# Altium footprint library Molex FFC - FPC Connectors (Through-Hole).PcbLib: 219 footprints (part 4 of 14)
Each footprint in its own frame and in the unit in brackets; x right, y up, seen from the top. Pads: shape width x height; smd on the part's side, far side on the other; paste and mask are expansions set on the pad; w line width, h text height; cw(c..) or ccw(c..) is an arc to the next point about the centre after c.
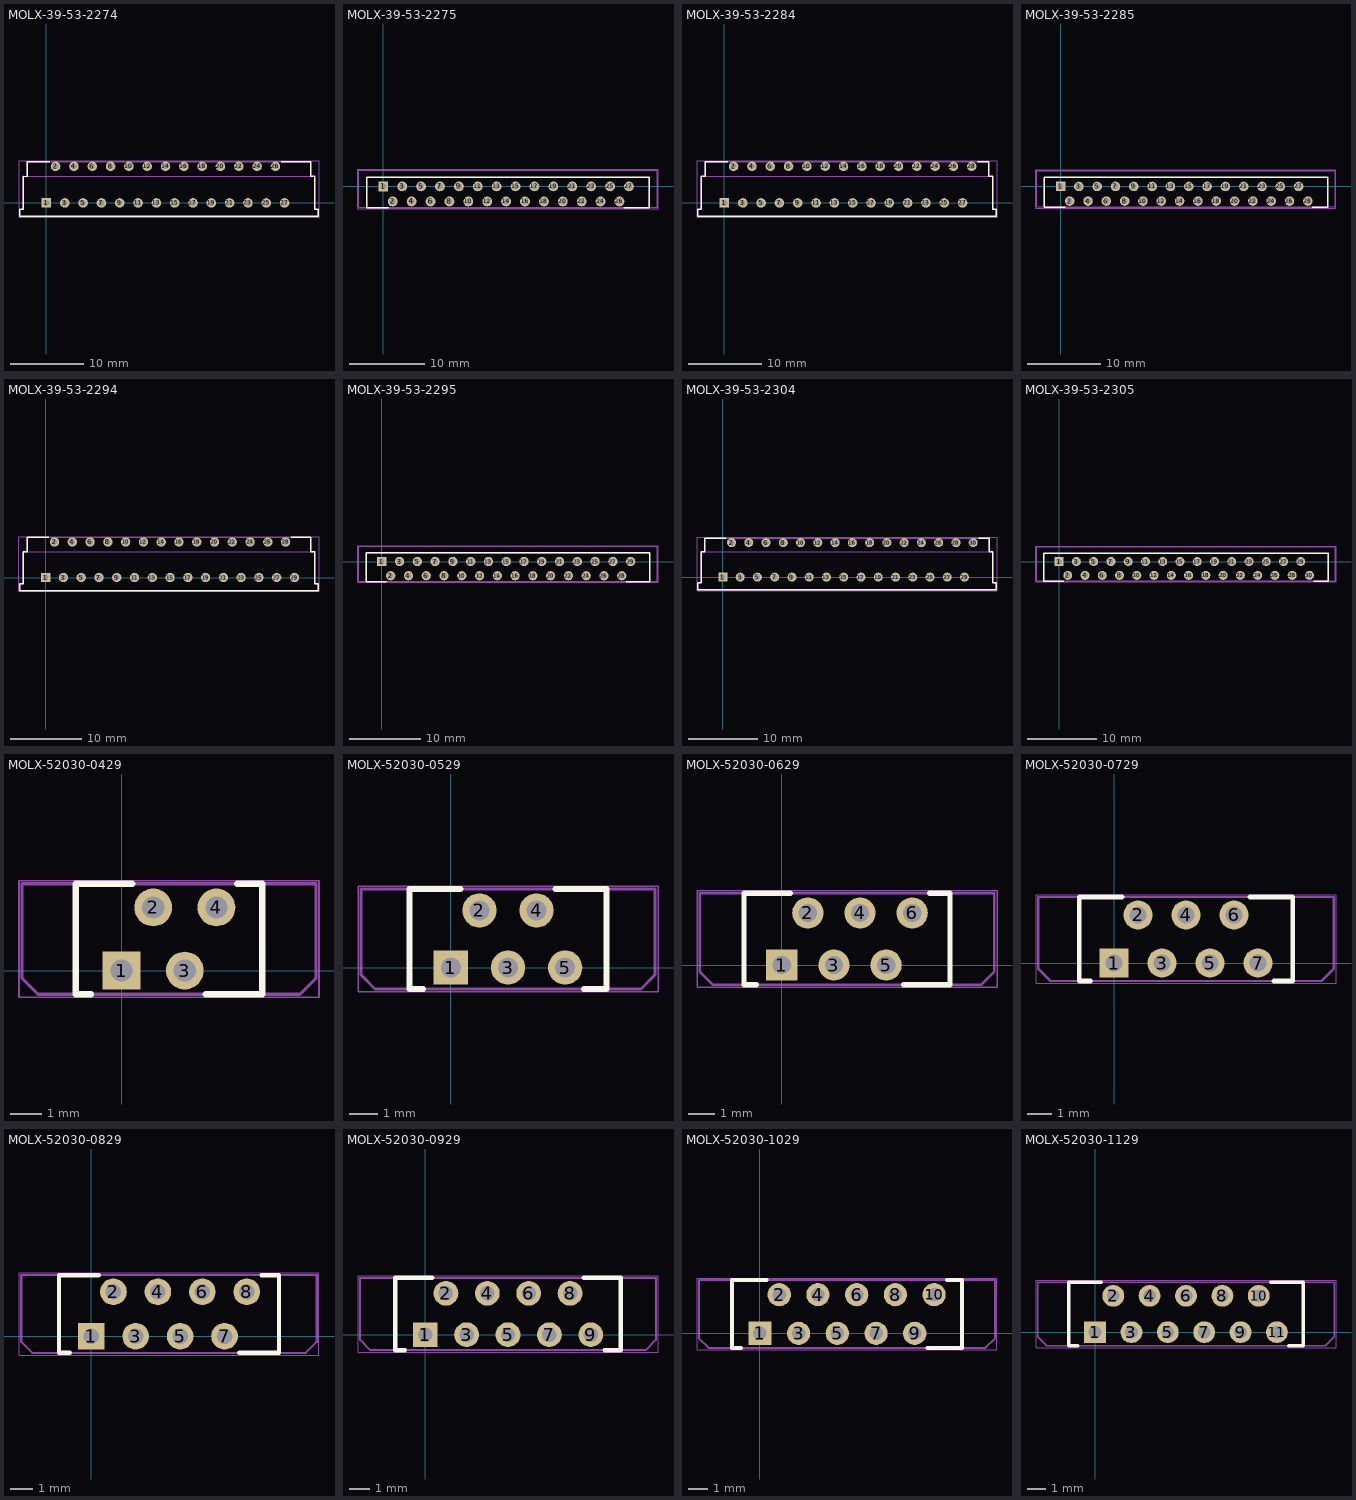
[diagram p3: the footprints below, top view; thin cyan lines are the x and y axes]

## MOLX-39-53-2274 [mm] "FPC Connector, 27-Leads, Right Angle, Pitch 1.25 mm, Mated Height 5.0 mm, Through Hole"
height 5.412
pads (27):
  rect 1.3x1.3 hole 0.8: 1(0,0)
  round 1.3 hole 0.8: 2(1.25,5) 3(2.5,0) 4(3.75,5) 5(5,0) 6(6.25,5) 7(7.5,0) 8(8.75,5) 9(10,0) 10(11.25,5) 11(12.5,0) 12(13.75,5) 13(15,0) 14(16.25,5) 15(17.5,0) 16(18.75,5) 17(20,0) 18(21.25,5) 19(22.5,0) 20(23.75,5) 21(25,0) 22(26.25,5) 23(27.5,0) 24(28.75,5) 25(30,0) 26(31.25,5) 27(32.5,0)
Top Overlay:
  lines w0.2: -2.62,3.6 -3.15,3.65 -3.15,-0.85 -3.65,-0.85 -3.65,-1.85 37.1,-1.85 37.1,-0.85 36.6,-0.85 36.6,3.65 36.07,3.65 36.07,5.65 32.075,5.65 ; -2.62,3.65 -2.62,5.65 0.425,5.65
Mechanical 13:
  lines w0.1: -2.62,3.65 -2.62,5.65 36.07,5.65 36.07,3.65 ; -2.62,3.65 -3.15,3.65 -3.15,-0.85 -3.65,-0.85 -3.65,-1.85 37.1,-1.85 37.1,-0.85 36.6,-0.85 36.6,3.65 36.07,3.65 ; -2.62,3.65 36.07,3.65
Mechanical 15:
  lines w0.05: -3.75,-1.95 -3.75,5.75 37.2,5.75 37.2,-1.95 -3.75,-1.95
3D body "039532284.stp": height 5.41, standoff -3.49, extent -3.649,-1.849 37.101,5.651

## MOLX-39-53-2275 [mm] "FPC Connector, 27-Leads, Vertical, Pitch 1.25 mm, Mated Height 7.5 mm, Through Hole"
height 7.512
pads (27):
  rect 1.3x1.3 hole 0.8: 1(0,0)
  round 1.3 hole 0.8: 2(1.25,-2) 3(2.5,0) 4(3.75,-2) 5(5,0) 6(6.25,-2) 7(7.5,0) 8(8.75,-2) 9(10,0) 10(11.25,-2) 11(12.5,0) 12(13.75,-2) 13(15,0) 14(16.25,-2) 15(17.5,0) 16(18.75,-2) 17(20,0) 18(21.25,-2) 19(22.5,0) 20(23.75,-2) 21(25,0) 22(26.25,-2) 23(27.5,0) 24(28.75,-2) 25(30,0) 26(31.25,-2) 27(32.5,0)
Top Overlay:
  lines w0.2: 0.633,-2.85 -2.22,-2.85 -2.22,1.22 35.22,1.22 35.22,-2.85 31.867,-2.85
Mechanical 13:
  lines w0.1: -3.25,-2.75 -3.25,2.15 36.25,2.15 36.25,-2.75 -3.25,-2.75 ; -2.22,-2.85 35.22,-2.85 35.22,1.22 -2.22,1.22 -2.22,-2.85
Mechanical 15:
  lines w0.05: -3.35,-2.95 36.35,-2.95 36.35,2.25 -3.35,2.25 -3.35,-2.95
3D body "039532275.stp": height 7.51, standoff -3.49, extent -3.25,-2.85 36.25,2.15

## MOLX-39-53-2284 [mm] "FPC Connector, 28-Leads, Right Angle, Pitch 1.25 mm, Mated Height 5.0 mm, Through Hole"
height 5.412
pads (28):
  rect 1.3x1.3 hole 0.8: 1(0,0)
  round 1.3 hole 0.8: 2(1.25,5) 3(2.5,0) 4(3.75,5) 5(5,0) 6(6.25,5) 7(7.5,0) 8(8.75,5) 9(10,0) 10(11.25,5) 11(12.5,0) 12(13.75,5) 13(15,0) 14(16.25,5) 15(17.5,0) 16(18.75,5) 17(20,0) 18(21.25,5) 19(22.5,0) 20(23.75,5) 21(25,0) 22(26.25,5) 23(27.5,0) 24(28.75,5) 25(30,0) 26(31.25,5) 27(32.5,0) 28(33.75,5)
Top Overlay:
  lines w0.2: 0.425,5.65 -2.62,5.65 -2.62,3.65 -3.15,3.65 -3.15,-0.85 -3.65,-0.85 -3.65,-1.85 37.1,-1.85 37.1,-0.85 36.6,-0.85 36.6,3.65 36.07,3.65 36.07,5.65 34.575,5.65 ; 37.075,-1.85 37.075,-1.85
Mechanical 13:
  lines w0.1: -2.62,3.65 36.07,3.65 ; -2.62,3.65 -2.62,5.65 36.07,5.65 36.07,3.65 ; -2.62,3.65 -3.15,3.65 -3.15,-0.85 -3.65,-0.85 -3.65,-1.85 37.1,-1.85 37.1,-0.85 36.6,-0.85 36.6,3.65 36.07,3.65
Mechanical 15:
  lines w0.05: -3.75,-1.95 37.2,-1.95 37.2,5.75 -3.75,5.75 -3.75,-1.95
3D body "039532284.stp": height 5.41, standoff -3.49, extent -3.65,-1.85 37.1,5.65

## MOLX-39-53-2285 [mm] "FPC Connector, 28-Leads, Vertical, Pitch 1.25 mm, Mated Height 7.5 mm, Through Hole"
height 7.512
pads (28):
  rect 1.3x1.3 hole 0.8: 1(0,0)
  round 1.3 hole 0.8: 2(1.25,-2) 3(2.5,0) 4(3.75,-2) 5(5,0) 6(6.25,-2) 7(7.5,0) 8(8.75,-2) 9(10,0) 10(11.25,-2) 11(12.5,0) 12(13.75,-2) 13(15,0) 14(16.25,-2) 15(17.5,0) 16(18.75,-2) 17(20,0) 18(21.25,-2) 19(22.5,0) 20(23.75,-2) 21(25,0) 22(26.25,-2) 23(27.5,0) 24(28.75,-2) 25(30,0) 26(31.25,-2) 27(32.5,0) 28(33.75,-2)
Top Overlay:
  lines w0.2: 0.633,-2.85 -2.22,-2.85 -2.22,1.22 36.47,1.22 36.47,-2.85 34.367,-2.85
Mechanical 13:
  lines w0.1: -3.25,-2.75 -3.25,2.15 37.5,2.15 37.5,-2.75 -3.25,-2.75 ; -2.22,-2.85 36.47,-2.85 36.47,1.22 -2.22,1.22 -2.22,-2.85
Mechanical 15:
  lines w0.05: -3.35,-2.95 37.6,-2.95 37.6,2.25 -3.35,2.25 -3.35,-2.95
3D body "039532285.stp": height 7.51, standoff -3.49, extent -3.25,-2.85 37.5,2.15

## MOLX-39-53-2294 [mm] "FPC Connector, 29-Leads, Right Angle, Pitch 1.25 mm, Mated Height 5.0 mm, Through Hole"
height 5.412
pads (29):
  rect 1.3x1.3 hole 0.8: 1(0,0)
  round 1.3 hole 0.8: 2(1.25,5) 3(2.5,0) 4(3.75,5) 5(5,0) 6(6.25,5) 7(7.5,0) 8(8.75,5) 9(10,0) 10(11.25,5) 11(12.5,0) 12(13.75,5) 13(15,0) 14(16.25,5) 15(17.5,0) 16(18.75,5) 17(20,0) 18(21.25,5) 19(22.5,0) 20(23.75,5) 21(25,0) 22(26.25,5) 23(27.5,0) 24(28.75,5) 25(30,0) 26(31.25,5) 27(32.5,0) 28(33.75,5) 29(35,0)
Top Overlay:
  lines w0.2: 0.425,5.65 -2.62,5.65 -2.62,3.65 -3.15,3.65 -3.15,-0.85 -3.65,-0.85 -3.65,-1.85 38.35,-1.85 38.35,-0.85 37.85,-0.85 37.85,3.65 37.32,3.65 37.32,5.65 34.575,5.65 ; 38.325,-1.85 38.325,-1.85
Mechanical 13:
  lines w0.1: -2.62,3.65 -2.62,5.65 37.32,5.65 37.32,3.65 ; -2.62,3.65 -3.15,3.65 -3.15,-0.85 -3.65,-0.85 -3.65,-1.85 38.35,-1.85 38.35,-0.85 37.85,-0.85 37.85,3.65 37.32,3.65 ; -2.62,3.65 37.32,3.65
Mechanical 15:
  lines w0.05: -3.75,-1.95 -3.75,5.75 38.45,5.75 38.45,-1.95 -3.75,-1.95
3D body "039532294.stp": height 5.41, standoff -3.49, extent -3.65,-1.85 38.35,5.651

## MOLX-39-53-2295 [mm] "FPC Connector, 29-Leads, Vertical, Pitch 1.25 mm, Mated Height 7.5 mm, Through Hole"
height 7.512
pads (29):
  rect 1.3x1.3 hole 0.8: 1(0,0)
  round 1.3 hole 0.8: 2(1.25,-2) 3(2.5,0) 4(3.75,-2) 5(5,0) 6(6.25,-2) 7(7.5,0) 8(8.75,-2) 9(10,0) 10(11.25,-2) 11(12.5,0) 12(13.75,-2) 13(15,0) 14(16.25,-2) 15(17.5,0) 16(18.75,-2) 17(20,0) 18(21.25,-2) 19(22.5,0) 20(23.75,-2) 21(25,0) 22(26.25,-2) 23(27.5,0) 24(28.75,-2) 25(30,0) 26(31.25,-2) 27(32.5,0) 28(33.75,-2) 29(35,0)
Top Overlay:
  lines w0.2: 0.633,-2.85 -2.22,-2.85 -2.22,1.22 37.72,1.22 37.72,-2.85 34.367,-2.85
Mechanical 13:
  lines w0.1: -3.25,-2.75 -3.25,2.15 38.75,2.15 38.75,-2.75 -3.25,-2.75 ; -2.22,-2.85 37.72,-2.85 37.72,1.22 -2.22,1.22 -2.22,-2.85
Mechanical 15:
  lines w0.05: -3.35,-2.95 38.85,-2.95 38.85,2.25 -3.35,2.25 -3.35,-2.95
3D body "039532295.stp": height 7.51, standoff -3.49, extent -3.25,-2.85 38.75,2.15

## MOLX-39-53-2304 [mm] "FPC Connector, 30-Leads, Right Angle, Pitch 1.25 mm, Mated Height 5.0 mm, Through Hole"
height 5.412
pads (30):
  rect 1.3x1.3 hole 0.8: 1(0,0)
  round 1.3 hole 0.8: 2(1.25,5) 3(2.5,0) 4(3.75,5) 5(5,0) 6(6.25,5) 7(7.5,0) 8(8.75,5) 9(10,0) 10(11.25,5) 11(12.5,0) 12(13.75,5) 13(15,0) 14(16.25,5) 15(17.5,0) 16(18.75,5) 17(20,0) 18(21.25,5) 19(22.5,0) 20(23.75,5) 21(25,0) 22(26.25,5) 23(27.5,0) 24(28.75,5) 25(30,0) 26(31.25,5) 27(32.5,0) 28(33.75,5) 29(35,0) 30(36.25,5)
Top Overlay:
  lines w0.2: 0.425,5.65 -2.62,5.65 -2.62,3.649 -3.15,3.649 -3.15,-0.85 -3.65,-0.85 -3.65,-1.85 39.6,-1.85 39.6,-0.85 39.1,-0.85 39.1,3.65 38.57,3.65 38.57,5.65 37.075,5.65 ; 39.575,-1.85 39.575,-1.85
Mechanical 13:
  lines w0.1: -2.62,3.649 -3.15,3.649 -3.15,-0.85 -3.65,-0.85 -3.65,-1.85 39.6,-1.85 39.6,-0.85 39.1,-0.85 39.1,3.65 38.57,3.65 38.57,5.65 -2.62,5.65 -2.62,3.649 38.569,3.649
Mechanical 15:
  lines w0.05: -3.75,-1.95 -3.75,5.75 39.7,5.75 39.7,-1.95 -3.75,-1.95
3D body "039532304.stp": height 5.41, standoff -3.49, extent -3.65,-1.85 39.6,5.65

## MOLX-39-53-2305 [mm] "FPC Connector, 30-Leads, Vertical, Pitch 1.25 mm, Mated Height 7.5 mm, Through Hole"
height 7.512
pads (30):
  rect 1.3x1.3 hole 0.8: 1(0,0)
  round 1.3 hole 0.8: 2(1.25,-2) 3(2.5,0) 4(3.75,-2) 5(5,0) 6(6.25,-2) 7(7.5,0) 8(8.75,-2) 9(10,0) 10(11.25,-2) 11(12.5,0) 12(13.75,-2) 13(15,0) 14(16.25,-2) 15(17.5,0) 16(18.75,-2) 17(20,0) 18(21.25,-2) 19(22.5,0) 20(23.75,-2) 21(25,0) 22(26.25,-2) 23(27.5,0) 24(28.75,-2) 25(30,0) 26(31.25,-2) 27(32.5,0) 28(33.75,-2) 29(35,0) 30(36.25,-2)
Top Overlay:
  lines w0.2: 0.633,-2.85 -2.22,-2.85 -2.22,1.22 38.97,1.22 38.97,-2.85 36.867,-2.85
Mechanical 13:
  lines w0.1: -3.25,-2.75 40,-2.75 40,2.15 -3.25,2.15 -3.25,-2.75 ; -2.22,-2.85 -2.22,1.22 38.97,1.22 38.97,-2.85 -2.22,-2.85
Mechanical 15:
  lines w0.05: -3.35,-2.95 -3.35,2.25 40.1,2.25 40.1,-2.95 -3.35,-2.95
3D body "039532305.stp": height 7.51, standoff -3.49, extent -3.25,-2.85 40,2.15

## MOLX-52030-0429 [mm] "FPC Connector, 4-Leads, Vertical, Pitch 1.0 mm, Mated Height 5.2 mm, Through Hole"
height 6.712
pads (4):
  rect 1.2x1.2 hole 0.7: 1(0,0)
  round 1.2 hole 0.7: 2(1,2) 3(2,0) 4(3,2)
Top Overlay:
  lines w0.2: -0.971,-0.75 -1.45,-0.75 -1.45,2.75 0.339,2.75 ; 2.661,-0.75 4.45,-0.75 4.45,2.75 3.662,2.75
Mechanical 13:
  lines w0.1: -1.45,-0.75 -1.45,2.75 ; 4.45,-0.75 4.45,2.75 ; 6.15,-0.25 6.15,2.75 -3.15,2.75 -3.15,-0.25 -2.65,-0.75 5.65,-0.75 6.15,-0.25
Mechanical 15:
  lines w0.05: -3.25,-0.85 6.25,-0.85 6.25,2.85 -3.25,2.85 -3.25,-0.85
3D body "520300429.stp": height 6.71, standoff -3.19, extent -3.15,-0.75 6.15,2.75

## MOLX-52030-0529 [mm] "FPC Connector, 5-Leads, Vertical, Pitch 1.0 mm, Mated Height 5.2 mm, Through Hole"
height 6.712
pads (5):
  rect 1.2x1.2 hole 0.7: 1(0,0)
  round 1.2 hole 0.7: 2(1,2) 3(2,0) 4(3,2) 5(4,0)
Top Overlay:
  lines w0.2: -0.971,-0.75 -1.45,-0.75 -1.45,2.75 0.339,2.75 ; 3.661,2.75 5.45,2.75 5.45,-0.75 4.661,-0.75
Mechanical 13:
  lines w0.1: -1.45,-0.75 -1.45,2.75 ; 5.45,-0.75 5.45,2.75 ; -3.15,-0.25 -2.65,-0.75 6.65,-0.75 7.15,-0.25 7.15,2.75 -3.15,2.75 -3.15,-0.25
Mechanical 15:
  lines w0.05: -3.25,-0.85 7.25,-0.85 7.25,2.85 -3.25,2.85 -3.25,-0.85
3D body "520300529.stp": height 6.71, standoff -3.19, extent -3.15,-0.75 7.15,2.75

## MOLX-52030-0629 [mm] "FPC Connector, 6-Leads, Vertical, Pitch 1.0 mm, Mated Height 5.2 mm, Through Hole"
height 6.712
pads (6):
  rect 1.2x1.2 hole 0.7: 1(0,0)
  round 1.2 hole 0.7: 2(1,2) 3(2,0) 4(3,2) 5(4,0) 6(5,2)
Top Overlay:
  lines w0.2: -0.971,-0.75 -1.45,-0.75 -1.45,2.75 0.339,2.75 ; 4.661,-0.75 6.45,-0.75 6.45,2.75 5.662,2.75
Mechanical 13:
  lines w0.1: -1.45,-0.75 -1.45,2.75 ; 6.45,-0.75 6.45,2.75 ; -3.15,-0.25 -3.15,2.75 8.15,2.75 8.15,-0.25 7.65,-0.75 -2.65,-0.75 -3.15,-0.25
Mechanical 15:
  lines w0.05: -3.25,-0.85 -3.25,2.85 8.25,2.85 8.25,-0.85 -3.25,-0.85
3D body "520300629.stp": height 6.71, standoff -3.19, extent -3.15,-0.75 8.15,2.75

## MOLX-52030-0729 [mm] "FPC Connector, 7-Leads, Vertical, Pitch 1.0 mm, Mated Height 5.2 mm, Through Hole"
height 6.712
pads (7):
  rect 1.2x1.2 hole 0.7: 1(0,0)
  round 1.2 hole 0.7: 2(1,2) 3(2,0) 4(3,2) 5(4,0) 6(5,2) 7(6,0)
Top Overlay:
  lines w0.2: -0.971,-0.75 -1.45,-0.75 -1.45,2.75 0.339,2.75 ; 5.661,2.75 7.45,2.75 7.45,-0.75 6.661,-0.75
Mechanical 13:
  lines w0.1: -1.45,-0.75 -1.45,2.75 ; 7.45,-0.75 7.45,2.75 ; -3.15,-0.25 -3.15,2.75 9.15,2.75 9.15,-0.25 8.65,-0.75 -2.65,-0.75 -3.15,-0.25
Mechanical 15:
  lines w0.05: -3.25,-0.85 -3.25,2.85 9.25,2.85 9.25,-0.85 -3.25,-0.85
3D body "520300729.stp": height 6.71, standoff -3.19, extent -3.15,-0.75 9.15,2.75

## MOLX-52030-0829 [mm] "FPC Connector, 8-Leads, Vertical, Pitch 1.0 mm, Mated Height 5.2 mm, Through Hole"
height 6.712
pads (8):
  rect 1.2x1.2 hole 0.7: 1(0,0)
  round 1.2 hole 0.7: 2(1,2) 3(2,0) 4(3,2) 5(4,0) 6(5,2) 7(6,0) 8(7,2)
Top Overlay:
  lines w0.2: -0.971,-0.75 -1.45,-0.75 -1.45,2.75 0.339,2.75 ; 6.661,-0.75 8.45,-0.75 8.45,2.75 7.662,2.75
Mechanical 13:
  lines w0.1: -1.45,-0.75 -1.45,2.75 ; 8.45,-0.75 8.45,2.75 ; -3.15,-0.25 -2.65,-0.75 9.65,-0.75 10.15,-0.25 10.15,2.75 -3.15,2.75 -3.15,-0.25
Mechanical 15:
  lines w0.05: -3.25,-0.85 10.25,-0.85 10.25,2.85 -3.25,2.85 -3.25,-0.85
3D body "520300829.stp": height 6.71, standoff -3.19, extent -3.15,-0.75 10.15,2.75

## MOLX-52030-0929 [mm] "FPC Connector, 9-Leads, Vertical, Pitch 1.0 mm, Mated Height 5.2 mm, Through Hole"
height 6.712
pads (9):
  rect 1.2x1.2 hole 0.7: 1(0,0)
  round 1.2 hole 0.7: 2(1,2) 3(2,0) 4(3,2) 5(4,0) 6(5,2) 7(6,0) 8(7,2) 9(8,0)
Top Overlay:
  lines w0.2: -0.971,-0.75 -1.45,-0.75 -1.45,2.75 0.339,2.75 ; 7.661,2.75 9.45,2.75 9.45,-0.75 8.661,-0.75
Mechanical 13:
  lines w0.1: -1.45,-0.75 -1.45,2.75 ; 9.45,-0.75 9.45,2.75 ; 11.15,-0.25 11.15,2.75 ; 11.15,-0.25 10.65,-0.75 -2.65,-0.75 -3.15,-0.25 -3.15,2.75 11.15,2.75
Mechanical 15:
  lines w0.05: -3.25,-0.85 11.25,-0.85 11.25,2.85 -3.25,2.85 -3.25,-0.85
3D body "520300929.stp": height 6.71, standoff -3.19, extent -3.15,-0.75 11.15,2.75

## MOLX-52030-1029 [mm] "FPC Connector, 10-Leads, Vertical, Pitch 1.0 mm, Mated Height 5.2 mm, Through Hole"
height 6.712
pads (10):
  rect 1.2x1.2 hole 0.7: 1(0,0)
  round 1.2 hole 0.7: 2(1,2) 3(2,0) 4(3,2) 5(4,0) 6(5,2) 7(6,0) 8(7,2) 9(8,0) 10(9,2)
Top Overlay:
  lines w0.2: -0.971,-0.75 -1.45,-0.75 -1.45,2.75 0.339,2.75 ; 8.661,-0.75 10.45,-0.75 10.45,2.75 9.662,2.75
Mechanical 13:
  lines w0.1: -1.45,-0.75 -1.45,2.75 ; 10.45,-0.75 10.45,2.75 ; -3.15,-0.25 -3.15,2.75 12.15,2.75 12.15,-0.25 11.65,-0.75 -2.65,-0.75 -3.15,-0.25
Mechanical 15:
  lines w0.05: -3.25,-0.85 -3.25,2.85 12.25,2.85 12.25,-0.85 -3.25,-0.85
3D body "520301029.stp": height 6.71, standoff -3.19, extent -3.15,-0.75 12.15,2.75

## MOLX-52030-1129 [mm] "FPC Connector, 11-Leads, Vertical, Pitch 1.0 mm, Mated Height 5.2 mm, Through Hole"
height 6.712
pads (11):
  rect 1.2x1.2 hole 0.7: 1(0,0)
  round 1.2 hole 0.7: 2(1,2) 3(2,0) 4(3,2) 5(4,0) 6(5,2) 7(6,0) 8(7,2) 9(8,0) 10(9,2) 11(10,0)
Top Overlay:
  lines w0.2: -0.971,-0.75 -1.45,-0.75 -1.45,2.75 0.339,2.75 ; 9.661,2.75 11.45,2.75 11.45,-0.75 10.661,-0.75
Mechanical 13:
  lines w0.1: -1.45,-0.75 -1.45,2.75 ; 11.45,-0.75 11.45,2.75 ; -3.15,-0.25 -2.65,-0.75 12.65,-0.75 13.15,-0.25 13.15,2.75 -3.15,2.75 -3.15,-0.25
Mechanical 15:
  lines w0.05: -3.25,-0.85 13.25,-0.85 13.25,2.85 -3.25,2.85 -3.25,-0.85
3D body "520301129.stp": height 6.71, standoff -3.19, extent -3.15,-0.75 13.15,2.75